# Altium footprint library ADP_Connector.PcbLib: 36 footprints (part 2 of 3)
Each footprint in its own frame and in the unit in brackets; x right, y up, seen from the top. Pads: shape width x height; smd on the part's side, far side on the other; paste and mask are expansions set on the pad; w line width, h text height; cw(c..) or ccw(c..) is an arc to the next point about the centre after c.
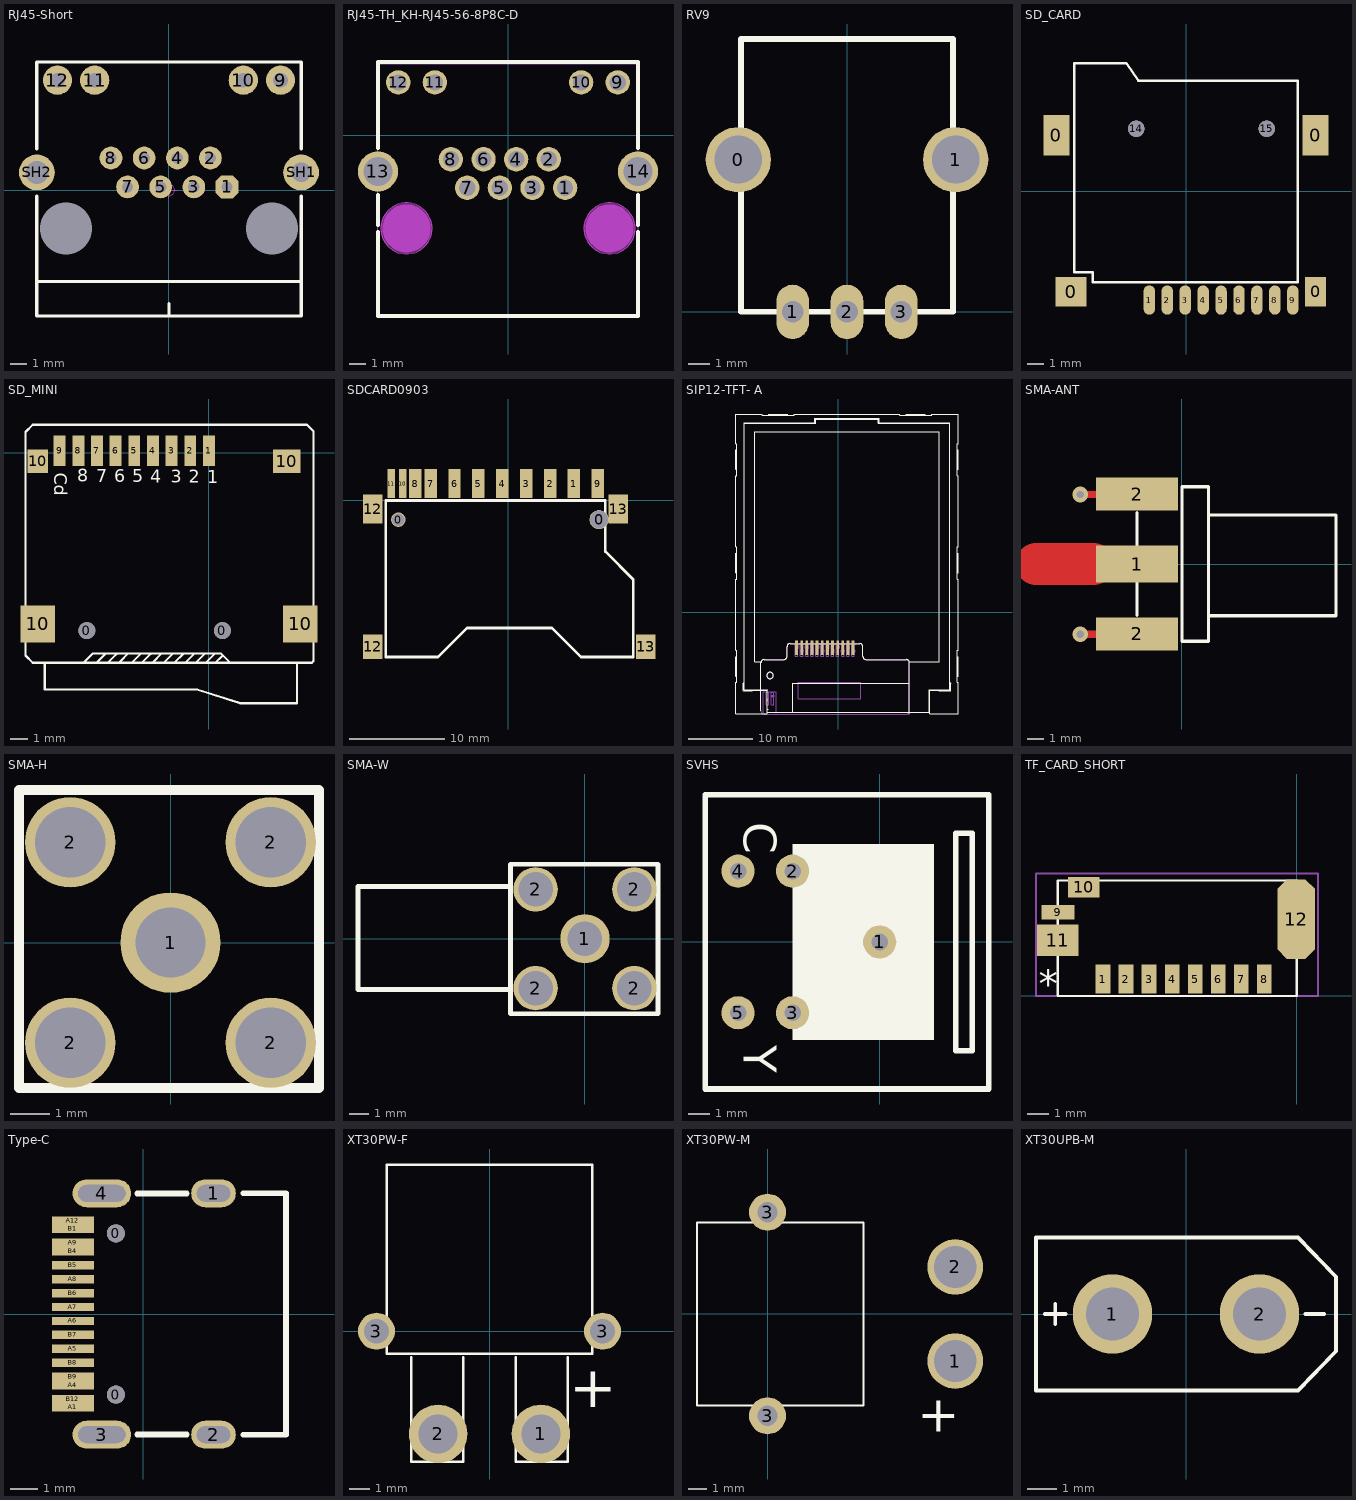
[diagram p1: the footprints below, top view; thin cyan lines are the x and y axes]

## RJ45-Short [mm] "RJ45屏蔽网络插座带LED"
height 16.9
pads (16):
  oct 1.4x1.4 hole 0.7: 1(3.57,0.19)
  round 1.4 hole 0.7: 2(2.55,1.97) 3(1.53,0.19) 4(0.51,1.97) 5(-0.51,0.19) 6(-1.53,1.97) 7(-2.55,0.19) 8(-3.57,1.97)
  round 0 hole 3.2 unplated: 9(-6.35,-2.363) 10(6.35,-2.363)
  round 1.8 hole 0.9 unplated: 9(6.86,6.757) 10(4.57,6.757) 11(-4.57,6.757) 12(-6.86,6.757)
  round 2.2 hole 1.2: SH1(8.128,1.08)
  round 2.2 hole 1.4: SH2(-8.128,1.08)
Top Overlay:
  lines w0.203: -8.128,-5.626 8.128,-5.626 ; -8.128,-0.381 -8.128,-7.747 8.128,-7.747 8.128,-0.381 ; 0,-7.747 0,-6.985 ; -8.128,2.54 -8.128,7.874 8.128,7.874 8.128,2.54 ; -8.128,2.54 -8.128,2.54 ; 8.128,2.54 8.128,2.54
Mechanical 15:
  circle w0.05: c0,0 r0.35
  lines w0.05: -0.5,0 0.5,0 ; 0,-0.5 0,0.5
3D body "RJ45-2LED.STEP": height 12.85, standoff -2.95, extent -7.95,-7.65 7.95,7.75

## RJ45-TH_KH-RJ45-56-8P8C-D [mil]
pads (14):
  round 60 hole 40.16: 1(140.55,-129.73) 2(100.4,-59.65) 3(60.24,-129.73) 4(20.08,-59.65) 5(-20.08,-129.73) 6(-60.23,-59.65) 7(-100.39,-129.73) 8(-140.55,-59.65)
  round 60 hole 40.16 copper offset -0.01,0.01: 9(270.09,129.72)
  round 60 hole 40.16 copper offset 0,0.01: 10(179.92,129.72) 11(-179.92,129.72) 12(-270.08,129.72)
  round 98.42 hole 70.87: 13(-320.08,-89.57) 14(320.08,-89.57)
Top Overlay:
  lines w10: -320,-238.13 -320,-445.19 320,-445.19 320,-238.13 ; -320,-221.31 -320,-147.8 ; -320,-31.33 -320,179.81 320,179.81 320,-31.33 ; 320,-221.31 320,-147.8
Keep-Out Layer:
  board cut-out: -187.01,-229.72 -187.01,-223.52 -189.43,-211.35 -194.18,-199.89 -201.07,-189.57 -209.84,-180.79 -220.16,-173.9 -231.62,-169.15 -243.79,-166.73 -256.2,-166.73 -268.37,-169.15 -279.84,-173.9 -290.15,-180.79 -298.93,-189.57 -305.82,-199.88 -310.57,-211.35 -312.99,-223.52 -312.99,-229.72 -312.99,-235.93 -310.57,-248.1 -305.82,-259.56 -298.93,-269.88 -290.16,-278.65 -279.84,-285.55 -268.37,-290.3 -256.2,-292.72 -243.8,-292.72 -231.63,-290.3 -220.16,-285.55 -209.84,-278.65 -201.07,-269.88 -194.18,-259.56 -189.43,-248.1 -187.01,-235.93 -187.01,-229.72
  board cut-out: 312.99,-229.72 312.99,-223.52 310.57,-211.35 305.82,-199.89 298.93,-189.57 290.16,-180.8 279.84,-173.9 268.37,-169.15 256.2,-166.73 243.8,-166.73 231.63,-169.15 220.16,-173.9 209.85,-180.79 201.07,-189.57 194.18,-199.89 189.43,-211.35 187.01,-223.52 187.01,-229.72 187.01,-235.93 189.43,-248.1 194.18,-259.56 201.07,-269.88 209.84,-278.65 220.16,-285.55 231.62,-290.3 243.79,-292.72 256.2,-292.72 268.37,-290.3 279.84,-285.55 290.15,-278.65 298.93,-269.88 305.82,-259.56 310.57,-248.1 312.99,-235.93 312.99,-229.72
Mechanical 1:
  circle w0.2: c-250,-229.72 r62.99
  circle w0.2: c250,-229.72 r62.99
Mechanical 6:
  circle w59.05: c-250,-229.72 r29.53
  circle w59.05: c250,-229.72 r29.53
Mechanical 15:
  drawing of 19 lines, arcs and shapes, not listed
Multi-Layer keep-out:
  region: -187.01,-229.72 -187.01,-223.52 -189.43,-211.35 -194.18,-199.89 -201.07,-189.57 -209.84,-180.79 -220.16,-173.9 -231.62,-169.15 -243.79,-166.73 -256.2,-166.73 -268.37,-169.15 -279.84,-173.9 -290.15,-180.79 -298.93,-189.57 -305.82,-199.88 -310.57,-211.35 -312.99,-223.52 -312.99,-229.72 -312.99,-235.93 -310.57,-248.1 -305.82,-259.56 -298.93,-269.88 -290.16,-278.65 -279.84,-285.55 -268.37,-290.3 -256.2,-292.72 -243.8,-292.72 -231.63,-290.3 -220.16,-285.55 -209.84,-278.65 -201.07,-269.88 -194.18,-259.56 -189.43,-248.1 -187.01,-235.93 -187.01,-229.72
  region: 312.99,-229.72 312.99,-223.52 310.57,-211.35 305.82,-199.89 298.93,-189.57 290.16,-180.8 279.84,-173.9 268.37,-169.15 256.2,-166.73 243.8,-166.73 231.63,-169.15 220.16,-173.9 209.85,-180.79 201.07,-189.57 194.18,-199.89 189.43,-211.35 187.01,-223.52 187.01,-229.72 187.01,-235.93 189.43,-248.1 194.18,-259.56 201.07,-269.88 209.84,-278.65 220.16,-285.55 231.62,-290.3 243.79,-292.72 256.2,-292.72 268.37,-290.3 279.84,-285.55 290.15,-278.65 298.93,-269.88 305.82,-259.56 310.57,-248.1 312.99,-235.93 312.99,-229.72

## RV9 [mm]
pads (5):
  round 3 hole 2.2: 0(-5,7) 1(5,7)
  oval 1.5x2.5 hole 1: 1(-2.5,0) 2(0,0) 3(2.5,0)
Top Overlay:
  lines w0.254: -4.876,0 -4.876,12.55 4.876,12.55 4.876,0 -4.876,0
3D body "User Library-RV09ACF-40_RK09K1130A5R.step": height 20, standoff -3.8, extent -4.876,0 4.876,12.55

## SD_CARD [mm]
pads (15):
  rect 1.6x2.5 smd: 0(-7.953,3.429) 0(7.947,3.429)
  rect 1.9x1.8 smd: 0(-7.053,-6.171)
  rect 1.3x1.8 smd: 0(7.947,-6.171)
  oval 0.7x1.8 smd: 1(-2.253,-6.671) 2(-1.153,-6.671) 3(-0.053,-6.671) 4(1.047,-6.671) 5(2.147,-6.671) 6(3.247,-6.671) 7(4.347,-6.671) 8(5.447,-6.671) 9(6.547,-6.671)
  round 1 hole 1: 14(-3.053,3.829) 15(4.947,3.829)
Top Overlay:
  lines w0.152: -6.858,-4.953 -5.715,-4.953 -5.715,-5.588 -5.08,-5.588 6.401,-5.588 6.858,-5.588 6.858,6.782 -2.921,6.782 -3.658,7.849 -6.858,7.849 -6.858,-4.572 -6.858,-4.953
3D body "SDcard.STEP": height 2.05, standoff -0.4, extent -8,-7.4 8,7.85

## SD_MINI [mm]
pads (15):
  round 1 hole 1 unplated: 0(-7.2,-10.5) 0(0.8,-10.5)
  rect 0.7x1.8 smd: 1(0,0.127) 2(-1.1,0.127) 3(-2.2,0.127) 4(-3.3,0.127) 5(-4.4,0.127) 6(-5.5,0.127) 7(-6.6,0.127) 8(-7.7,0.127) 9(-8.8,0.127)
  rect 2.032x2.2 smd: 10(-10.1,-10.1) 10(5.4,-10.1)
  rect 1.2x1.4 smd: 10(-10.1,-0.5)
  rect 1.6x1.4 smd: 10(4.6,-0.5)
Top Overlay:
  lines w0.127: -9.677,-12.395 -9.677,-13.97 -0.686,-13.97 ; -6.629,-12.395 -6.096,-11.862 -6.096,-11.836 ; -5.969,-12.395 -5.461,-11.887 -5.461,-11.836 ; -5.232,-12.395 -5.232,-12.319 -4.75,-11.836 ; -4.547,-12.395 -3.988,-11.836 -3.962,-11.836 ; -3.962,-12.395 -3.429,-11.862 -3.429,-11.836 ; -3.327,-12.395 -2.769,-11.836 -2.667,-11.836 ; -2.667,-12.395 -2.108,-11.836 -2.083,-11.836 ; -2.032,-12.395 -1.499,-11.862 -1.499,-11.836 ; -1.397,-12.395 -0.838,-11.836 -0.711,-11.836 ; -0.762,-12.395 -0.203,-11.836 -0.178,-11.836 ; -0.711,-13.97 1.854,-14.783 5.207,-14.783 5.207,-12.421 ; -0.178,-12.395 0.381,-11.836 ; 0.381,-12.395 0.787,-11.989 0.864,-11.989 ; -10.389,-12.395 -10.82,-11.963 -10.82,1.219 -10.389,1.651 5.791,1.651 6.172,1.27 6.172,-12.294 6.071,-12.395 ; -10.389,-12.395 6.071,-12.395 ; -10.389,-12.395 -7.391,-12.395 -6.833,-11.836 0.711,-11.836 1.27,-12.395 6.071,-12.395
  text "Cd" at -9.119,-1.168 h0.76
  text "8" at -7.772,-1.727 h0.76
  text "7" at -6.655,-1.753 h0.76
  text "6" at -5.588,-1.753 h0.76
  text "5" at -4.521,-1.753 h0.76
  text "4" at -3.454,-1.778 h0.76
  text "3" at -2.261,-1.778 h0.76
  text "2" at -1.194,-1.778 h0.76
  text "1" at -0.102,-1.803 h0.76
3D body "sdcard.STEP": height 1.8, standoff -0.7, extent -10.372,-14.725 5.901,0.469

## SDCARD0903 [mm] "SD卡插座0903"
pads (17):
  round 1.524 hole 1.321: 0(-11.5,-2)
  round 2 hole 1.9: 0(9.5,-2)
  rect 1.3x3 smd: 1(6.875,1.778) 2(4.375,1.778) 3(1.875,1.778) 4(-0.625,1.778) 5(-3.125,1.778) 6(-5.625,1.778) 7(-8.125,1.778) 8(-9.75,1.778) 9(9.375,1.778)
  rect 0.762x3 smd: 10(-11.05,1.778) 11(-12.25,1.778)
  rect 2.032x2.54 smd: 12(-14.2,-15.3) 13(14.4,-15.3)
  rect 2.032x3.048 smd: 12(-14.2,-0.9) 13(11.5,-0.9)
Top Overlay:
  lines w0.279: -12.827,-16.383 -12.827,0 10.16,0 10.16,-5.334 13.081,-8.255 13.081,-16.383 7.62,-16.383 4.572,-13.335 0,-13.335 -4.318,-13.335 -7.366,-16.383 -12.827,-16.383
3D body "SD Kart.step": height 3, standoff -1, extent -14.224,-28.564 14.376,1.436

## SIP12-TFT- A [mm]
pads (12):
  rect 0.43x2.3 smd: 1(2.305,-5.523) 2(1.505,-5.523) 3(0.705,-5.523) 4(-0.095,-5.523) 5(-0.895,-5.523) 6(-1.695,-5.523) 7(-2.495,-5.523) 8(-3.295,-5.523) 9(-4.095,-5.523) 10(-4.895,-5.523) 11(-5.695,-5.523) 12(-6.495,-5.523)
Top Overlay:
  circle w0.127: c-10.635,-9.83 r0.5
  lines w0.127: -15.793,-9.916 -15.993,-9.916 ; -15.793,-6.916 -15.993,-6.916 ; -15.793,6.184 -15.993,6.184 ; -15.793,9.184 -15.993,9.184 ; -15.793,22.284 -15.993,22.284 ; -15.793,25.284 -15.993,25.284 ; -14.243,-12.202 -14.243,-12.052 ; -12.036,-15.354 -12.036,-7.854 cw(c-11.536,-7.854) -11.536,-7.354 -8.476,-7.354 ccw(c-8.476,-6.854) -7.976,-6.854 -7.976,-5.354 cw(c-7.476,-5.354) -7.476,-4.854 3.324,-4.854 cw(c3.324,-5.354) 3.824,-5.354 3.824,-6.854 ccw(c4.324,-6.854) 4.324,-7.354 10.574,-7.354 cw(c10.574,-7.854) 11.074,-7.854 11.074,-15.516 ; -12.036,-7.696 -13.009,-7.696 -13.009,28.144 15.723,28.144 15.723,-7.696 11.074,-7.696 ; -11.043,-15.566 14.257,-15.566 ; -10.943,-15.516 14.157,-15.516 14.157,-12.052 17.323,-12.052 17.323,29.468 6.257,29.468 6.257,30.084 -3.543,30.084 -3.543,29.468 -14.609,29.468 -14.609,-12.052 -10.943,-12.052 ; -10.943,-15.066 -11.043,-15.066 -10.893,-15.066 ; -10.84,30.684 -10.84,30.884 ; -8.643,-15.566 -8.643,-15.516 ; -7.84,30.684 -7.84,30.884 ; -7.083,-15.494 -7.083,-11.002 11.057,-11.002 11.057,-15.824 ; 10.555,30.684 10.555,30.884 ; 11.857,-15.566 11.857,-15.516 ; 13.555,30.684 13.555,30.884 ; 14.107,-15.066 14.257,-15.066 14.157,-15.066 ; 17.157,-12.202 17.157,-12.052 ; 17.373,-4.466 17.373,22.214 ; 18.507,-9.916 18.707,-9.916 ; 18.507,-6.916 18.707,-6.916 ; 18.507,6.184 18.707,6.184 ; 18.507,9.184 18.707,9.184 ; 18.507,22.284 18.707,22.284 ; 18.507,25.284 18.707,25.284 ; -15.993,-9.916 -15.993,-6.916 ; -15.993,-9.916 -15.993,-6.916 ; -15.993,6.184 -15.993,9.184 ; -15.993,6.184 -15.993,9.184 ; -15.993,22.284 -15.993,25.284 ; -15.993,22.284 -15.993,25.284 ; -10.84,30.884 -7.84,30.884 ; -10.84,30.884 -7.84,30.884 ; 10.555,30.884 13.555,30.884 ; 10.555,30.884 13.555,30.884 ; 18.707,-9.916 18.707,-6.916 ; 18.707,-9.916 18.707,-6.916 ; 18.707,6.184 18.707,9.184 ; 18.707,6.184 18.707,9.184 ; 18.707,22.284 18.707,25.284 ; 18.707,22.284 18.707,25.284 ; -15.993,-15.816 -15.993,-10.916 -15.793,-10.916 -15.793,-5.916 -15.993,-5.916 -15.993,5.184 -15.793,5.184 -15.793,10.184 -15.993,10.184 -15.993,21.284 -15.793,21.284 -15.793,26.284 -15.993,26.284 -15.993,30.884 -11.84,30.884 -11.84,30.684 -6.84,30.684 -6.84,30.884 9.555,30.884 9.555,30.684 14.555,30.684 14.555,30.884 18.707,30.884 18.707,26.284 18.507,26.284 18.507,21.284 18.707,21.284 18.707,10.184 18.507,10.184 18.507,5.184 18.707,5.184 18.707,-5.916 18.507,-5.916 18.507,-10.916 18.707,-10.916 18.707,-15.816 14.257,-15.816 14.257,-12.102 15.527,-12.102 15.657,-12.202 17.473,-12.202 17.473,-11.062 17.373,-10.898 17.373,29.518 6.357,29.518 6.357,30.184 -3.643,30.184 -3.643,29.518 -14.659,29.518 -14.659,-10.898 -14.759,-11.062 -14.759,-12.202 -13.366,-12.202 -13.259,-12.102 -11.043,-12.102 -11.043,-15.816 -15.993,-15.816
Mechanical 3:
  drawing of 186 lines, arcs and shapes, not listed
  text "A" at -10.395,-14.839 h0.41
  text "K" at -11.202,-14.855 h0.41
3D body "LCD.STEP": height 2.2, standoff 0, extent -15.9,-15.68 18.6,30.92

## SMA-ANT [mil] "142-0701-801/806"
pads (3):
  rect 200x90 smd: 1(-109,0)
  rect 200x80 all layers, no hole: 2(-109,-170) 2(-109,170)
via -247,-171 diameter 38 hole 18
via -247,169 diameter 38 hole 18
Top Layer:
  lines w18: -248,169 -128,169 ; -247,-171 -99,-171
  lines w103: -355,0 -216,0
Top Overlay:
  lines w7.87: -109,-125 -109,125 ; 68,-126 375,-126 375,119 68,119 ; 0,-188 0,188 65,188 65,-188 0,-188
3D body "SMA - 50 Ohm Connectors 142-0701-801.step": height 175.51, standoff -136.3, extent -190.91,-186 370.9,188.8

## SMA-H [mil]
pads (5):
  round 100 hole 70: 1(0,0)
  round 90 hole 70: 2(-100,-100) 2(-100,100) 2(100,-100) 2(100,100)
Top Overlay:
  lines w10: -151,-145 148,-145 148,152 -151,152 -151,-145
3D body "SMA-H.stp": height 105.71, standoff -430.31, extent -124.21,-124.2 124.21,124.22

## SMA-W [mil]
pads (5):
  round 100 hole 70: 1(0,0)
  round 90 hole 70: 2(-100,-100) 2(-100,100) 2(100,-100) 2(100,100)
Top Overlay:
  lines w10: -152,-103 -460,-103 -460,106 -151,106 ; -151,-152 -151,151 148,151 148,-152 -151,-152
3D body "Samtec-SMA-J-P-H-RA-TH1.step": height 108.06, standoff -447.24, extent -459.69,-139.8 134.8,135.79

## SVHS [mil] "S VIDEO PORT"
pads (5):
  round 60 hole 30: 1(0,0) 2(-157.48,127.95) 3(-157.48,-127.95) 4(-255.91,127.95) 5(-255.91,-127.95)
Top Overlay:
  rectangle: -157.48,-177.17 98.43,177.17
  lines w10: -314.96,-265.75 -314.96,265.75 196.85,265.75 196.85,-265.75 -314.96,-265.75 ; 137.8,-196.85 167.32,-196.85 167.32,196.85 137.8,196.85 137.8,-196.85
  text "Y" at -246.06,-187.01 h60
  text "C" at -246.06,216.54 h60
3D body "SVHS.STEP": height 767.72, standoff -59.06, extent -314.96,-255.9 118.11,255.91

## TF_CARD_SHORT [mm]
height 1
pads (12):
  rect 0.7x1.4 smd: 1(-9.25,0.8) 2(-8.15,0.8) 3(-7.05,0.8) 4(-5.95,0.8) 5(-4.85,0.8) 6(-3.75,0.8) 7(-2.65,0.8) 8(-1.55,0.8)
  rect 1.58x0.7 smd: 9(-11.399,3.991)
  rect 1.5x1 smd: 10(-10.16,5.182)
  rect 2x1.5 smd: 11(-11.41,2.66)
  oct 1.8x3.8 smd: 12(-0.025,3.658)
Top Overlay:
  lines w0.1: -11.41,0 -11.41,5.5 0,5.5 0,0 -11.41,0
  text "*" at -12.319,-0.508 h2.29
Mechanical 15:
  lines w0.1: -12.446,0 -12.446,5.842 1.016,5.842 1.016,0 -12.446,0

## Type-C [mm]
pads (22):
  round 0.65 hole 0.65: 0(-0.98,-2.89) 0(-0.98,2.89)
  oval 1.6x1 hole 0.6 slot 1.2 at 0 deg: 1(2.52,4.325) 2(2.52,-4.325)
  oval 2.1x1 hole 0.6 slot 1.7 at 0 deg: 3(-1.48,-4.325) 4(-1.48,4.325)
  rect 1.5x0.3 smd: A1(-2.52,-3.35) A4(-2.52,-2.55) A5(-2.52,-1.25) A6(-2.52,-0.25) A7(-2.52,0.25) A8(-2.52,1.25) A9(-2.52,2.55) A12(-2.52,3.35) B1(-2.52,3.05) B4(-2.52,2.25) B5(-2.52,1.75) B6(-2.52,0.75) B7(-2.52,-0.75) B8(-2.52,-1.75) B9(-2.52,-2.25) B12(-2.52,-3.05)
Top Overlay:
  lines w0.203: -0.218,-4.318 1.56,-4.318 ; -0.218,4.318 1.56,4.318 ; 3.592,-4.325 5.12,-4.325 5.12,4.325 3.592,4.325
3D body "TypeC-SMD16P.STEP": height 3.36, standoff -0.9, extent -2.542,-4.458 5.209,4.492

## XT30PW-F [mm]
pads (4):
  round 2.85 hole 1.9: 1(2.5,-5) 2(-2.5,-5)
  round 1.8 hole 1.2: 3(-5.5,0) 3(5.5,0)
Top Overlay:
  lines w0.127: -3.81,-1.27 -3.81,-5.08 -3.81,-6.35 -1.27,-6.35 -1.27,-1.27 ; 1.27,-1.27 1.27,-6.35 3.81,-6.35 3.81,-1.27 ; -5,-1.1 -5,8.1 5,8.1 5,-1.1 -5,-1.1
  text "+" at 6.2,-3.7 h2

## XT30PW-M [mm]
height 1.524
pads (4):
  round 3 hole 2.286 paste+0 mask+0.05: 1(10.14,-2.54) 2(10.14,2.54)
  round 2 hole 1.1 paste+0 mask+0.05: 3(0,-5.5) 3(0,5.5)
Top Overlay:
  lines w0.1: -3.81,-4.95 -3.81,0 -3.81,4.95 5.19,4.95 5.19,-4.95 -3.81,-4.95
  text "+" at 10.394,-6.35 h2
3D body "XT30PW-M.STEP": height 5.15, standoff -2.05, extent -3.052,-6.65 10.898,6.65

## XT30UPB-M [mm]
pads (2):
  round 2.7 hole 1.8: 1(-2.5,0) 2(2.5,0)
Top Overlay:
  lines w0.127: -4.8,0 -4.1,0 ; -4.445,-0.35 -4.445,0.35 ; 4.064,0 4.699,0 ; -5.1,-2.6 -5.1,2.6 3.81,2.6 5.1,1.27 5.1,-1.27 3.81,-2.6 -5.1,-2.6